# Altium footprint library IC.PcbLib: 220 footprints (part 6 of 14)
Each footprint in its own frame and in the unit in brackets; x right, y up, seen from the top. Pads: shape width x height; smd on the part's side, far side on the other; paste and mask are expansions set on the pad; w line width, h text height; cw(c..) or ccw(c..) is an arc to the next point about the centre after c.
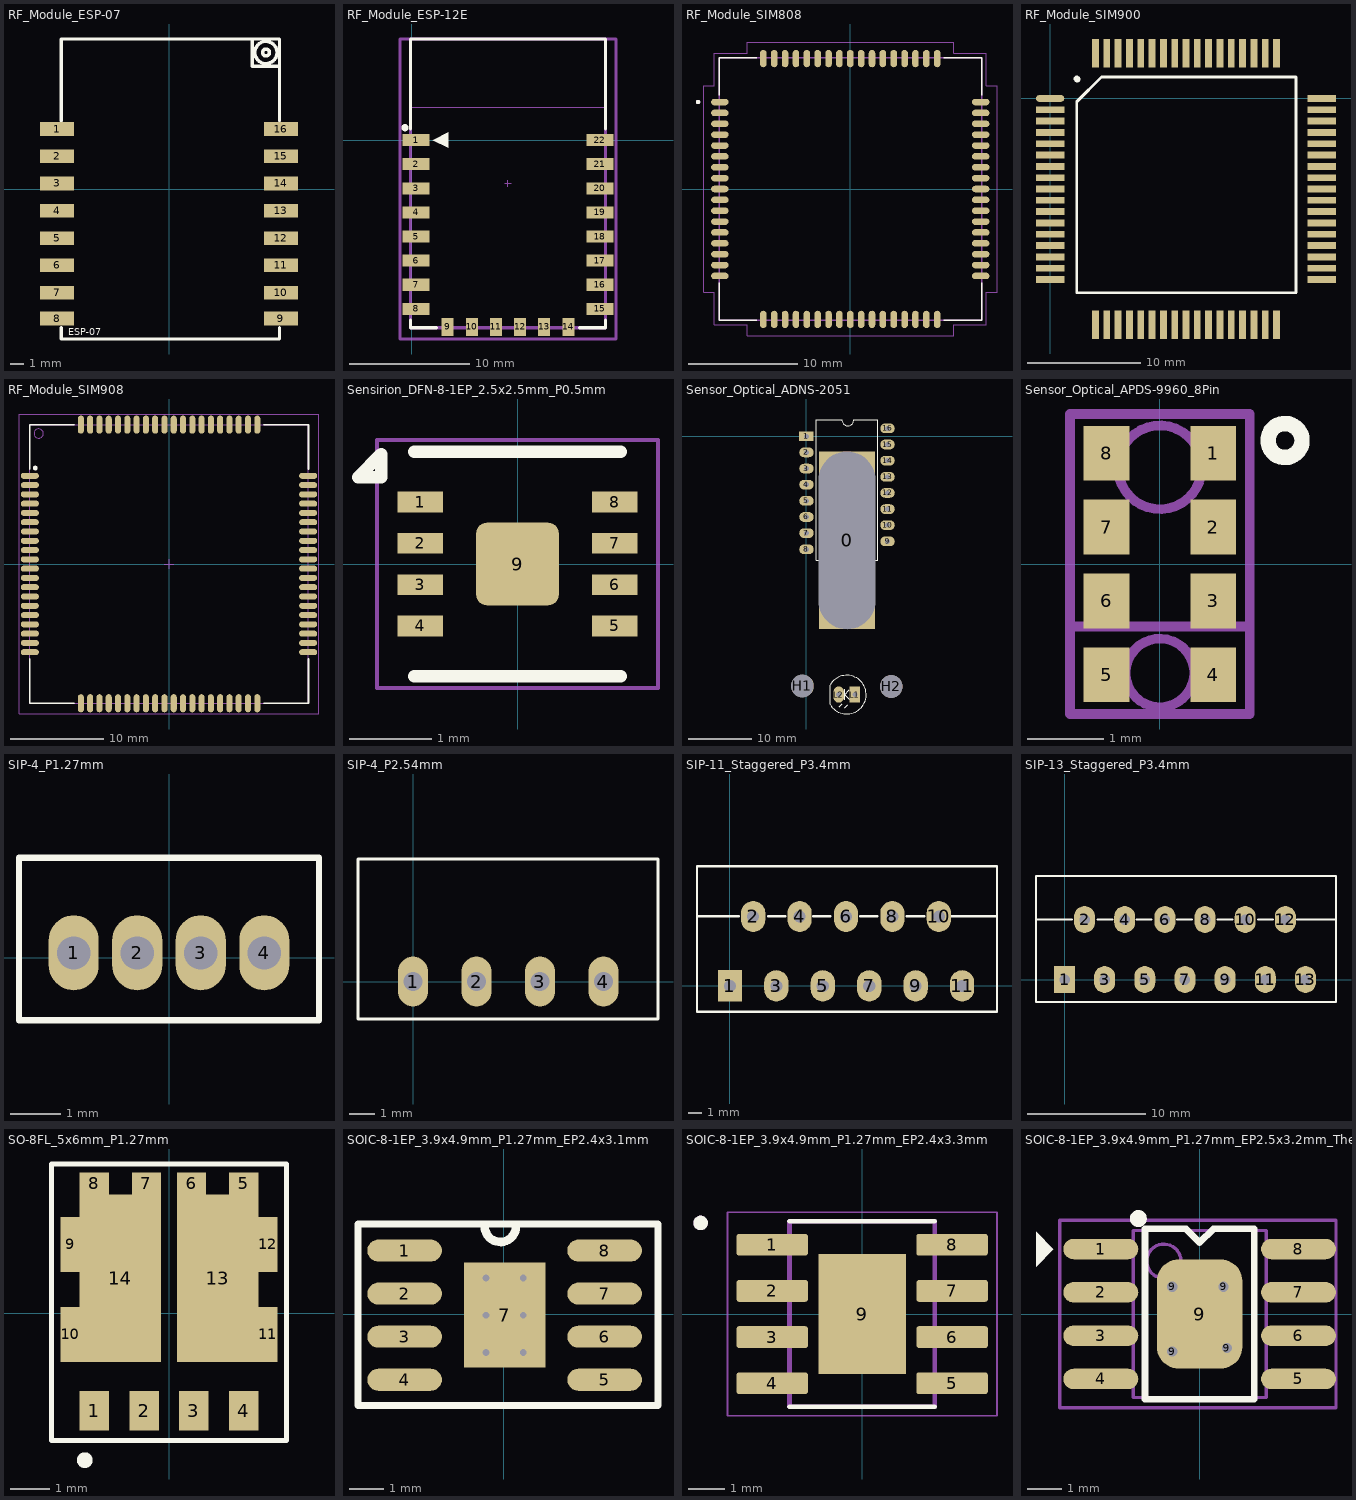
[diagram p5: the footprints below, top view; thin cyan lines are the x and y axes]

## RF_Module_ESP-07 [mil] "Ai-Thinker ESP-07 ESP8266 Wi-Fi module, 16 pads, pitch 2.0mm"
pads (16):
  rect 98.4x39.4 smd: 1(-323,173) 2(-323,95) 3(-323,16) 4(-323,-63) 5(-323,-142) 6(-323,-220) 7(-323,-299) 8(-323,-374) 9(323,-374) 10(323,-299) 11(323,-220) 12(323,-142) 13(323,-63) 14(323,16) 15(323,95) 16(323,173)
Top Overlay:
  circle w10: c280,394 r10
  circle w10: c280,394 r32
  lines w10: -311,-400 -311,-433 319,-433 319,-400 ; -311,197 -311,433 240,433 ; 319,197 319,354 ; 240,433 240,354 319,354 ; 240,433 319,433 319,354
  text "ESP-07" at -291,-422 h20
3D body "ESP07.STEP": height 137.87, standoff -0.39, extent -311,-434.15 318.92,432

## RF_Module_ESP-12E [mm] "Ai-Thinker ESP-12E/F ESP8266 Wi-Fi module, 22 pads, pitch 2.0mm"
height 3.2
pads (22):
  rect 2.25x1 smd: 1(0.375,0) 2(0.375,-2) 3(0.375,-4) 4(0.375,-6) 5(0.375,-8) 6(0.375,-10) 7(0.375,-12) 8(0.375,-14) 15(15.625,-14) 16(15.625,-12) 17(15.625,-10) 18(15.625,-8) 19(15.625,-6) 20(15.625,-4) 21(15.625,-2) 22(15.625,0)
  rect 1x1.5 smd: 9(3,-15.5) 10(5,-15.5) 11(7,-15.5) 12(9,-15.5) 13(11,-15.5) 14(13,-15.5)
Top Overlay:
  circle w0.3: c-0.55,1.025 r0.15
  region: 1.77,0 3.04,-0.635 3.04,0.635
  lines w0.254: -0.084,-14.916 -0.084,-15.568 2.068,-15.568 ; -0.084,0.916 -0.084,8.371 16.084,8.371 16.084,0.916 ; 13.932,-15.568 16.084,-15.568 16.084,-14.916
Mechanical 13:
  lines w0.051: -0.127,2.727 16.129,2.727 16.129,8.382 -0.127,8.382 -0.127,2.727
  lines w0.254: -0.084,-15.568 -0.084,8.371 16.084,8.371 16.084,-15.568 -0.084,-15.568
  text "ANTENNA AREA" at 0.127,7.874 h0.25
  text "CUTOUT POLYGON" at 0.127,7.366 h0.25
Mechanical 15:
  lines w0.1: 7.746,-3.598 8.254,-3.598 ; 8,-3.852 8,-3.344
  lines w0.254: -0.975,-16.5 16.975,-16.5 16.975,8.371 -0.975,8.371 -0.975,-16.5
3D body "ESP_12_E.STEP": height 2.75, standoff 0.04, extent 0.001,-15.491 16.001,8.509

## RF_Module_SIM808 [mm] "SIMCom SIM808 GSM/GPRS + GPS module, 68 pads, pitch 1.0mm"
pads (68):
  oval 1.6x0.6 smd: 1(-12,8) 2(-12,7) 3(-12,6) 4(-12,5) 5(-12,4) 6(-12,3) 7(-12,2) 8(-12,1) 9(-12,0) 10(-12,-1) 11(-12,-2) 12(-12,-3) 13(-12,-4) 14(-12,-5) 15(-12,-6) 16(-12,-7) 17(-12,-8) 35(12,-8) 36(12,-7) 37(12,-6) 38(12,-5) 39(12,-4) 40(12,-3) 41(12,-2) 42(12,-1) 43(12,0) 44(12,1) 45(12,2) 46(12,3) 47(12,4) 48(12,5) 49(12,6) 50(12,7) 51(12,8)
  oval 0.6x1.6 smd: 18(-8,-12) 19(-7,-12) 20(-6,-12) 21(-5,-12) 22(-4,-12) 23(-3,-12) 24(-2,-12) 25(-1,-12) 26(0,-12) 27(1,-12) 28(2,-12) 29(3,-12) 30(4,-12) 31(5,-12) 32(6,-12) 33(7,-12) 34(8,-12) 52(8,12) 53(7,12) 54(6,12) 55(5,12) 56(4,12) 57(3,12) 58(2,12) 59(1,12) 60(0,12) 61(-1,12) 62(-2,12) 63(-3,12) 64(-4,12) 65(-5,12) 66(-6,12) 67(-7,12) 68(-8,12)
Top Overlay:
  circle w0.2: c-14,8 r0.1
  lines w0.127: -12.075,-8.62 -12.075,-12.075 -8.62,-12.075 ; -12.075,8.62 -12.075,12.075 -8.62,12.075 ; 8.62,-12.075 12.075,-12.075 12.075,-8.62 ; 8.62,12.075 12.075,12.075 12.075,8.62
Mechanical 13:
  circle w0.2: c-14,8 r0.1
  lines w0.127: -12.075,-12.075 -12.075,12.075 12.075,12.075 12.075,-12.075 -12.075,-12.075
Mechanical 15:
  lines w0.05: -13.5,-9.5 -13.5,9.5 -12.5,9.5 -12.5,12.5 -9.5,12.5 -9.5,13.5 9.5,13.5 9.5,12.5 12.5,12.5 12.5,9.5 13.5,9.5 13.5,-9.5 12.5,-9.5 12.5,-12.5 9.5,-12.5 9.5,-13.5 -9.5,-13.5 -9.5,-12.5 -12.5,-12.5 -12.5,-9.5 -13.5,-9.5
3D body "SIM808--3DModel-STEP-56544.STEP": height 2.8, standoff 0, extent -12,-11.935 12,12.065

## RF_Module_SIM900 [mm] "SIMCom SIM900/900A GSM/GPRS module, 68 pads, pitch 1.0mm"
pads (68):
  oval 2.5x0.6 smd: 1(0,0)
  rect 2.5x0.6 smd: 2(0,-1) 3(0,-2) 4(0,-3) 5(0,-4) 6(0,-5) 7(0,-6) 8(0,-7) 9(0,-8) 10(0,-9) 11(0,-10) 12(0,-11) 13(0,-12) 14(0,-13) 15(0,-14) 16(0,-15) 17(0,-16) 35(24,-16) 36(24,-15) 37(24,-14) 38(24,-13) 39(24,-12) 40(24,-11) 41(24,-10) 42(24,-9) 43(24,-8) 44(24,-7) 45(24,-6) 46(24,-5) 47(24,-4) 48(24,-3) 49(24,-2) 50(24,-1) 51(24,0)
  rect 0.6x2.5 smd: 18(4,-20) 19(5,-20) 20(6,-20) 21(7,-20) 22(8,-20) 23(9,-20) 24(10,-20) 25(11,-20) 26(12,-20) 27(13,-20) 28(14,-20) 29(15,-20) 30(16,-20) 31(17,-20) 32(18,-20) 33(19,-20) 34(20,-20) 52(20,4) 53(19,4) 54(18,4) 55(17,4) 56(16,4) 57(15,4) 58(14,4) 59(13,4) 60(12,4) 61(11,4) 62(10,4) 63(9,4) 64(8,4) 65(7,4) 66(6,4) 67(5,4) 68(4,4)
Top Overlay:
  lines w0.25: 2.586,-17.16 21.697,-17.16 21.717,-17.14 21.717,1.547 ; 2.675,-17.163 2.357,-17.163 2.347,-17.153 2.347,-0.297 4.526,1.882 21.707,1.882 21.714,1.875 21.714,1.478
  lines w0.55: 2.349,1.73 2.4,1.679 2.413,1.679 2.416,1.679 2.423,1.687
3D body "SIM900.step": height 3.04, standoff 0.02, extent 0,-20 24,4

## RF_Module_SIM908 [mm] "SIMCom SIM908 GSM/GPRS + GPS module, 80 pads, pitch 1.0mm"
height 3
pads (80):
  oval 1.95x0.65 smd: 1(-15,9.5) 2(-15,8.5) 3(-15,7.5) 4(-15,6.5) 5(-15,5.5) 6(-15,4.5) 7(-15,3.5) 8(-15,2.5) 9(-15,1.5) 10(-15,0.5) 11(-15,-0.5) 12(-15,-1.5) 13(-15,-2.5) 14(-15,-3.5) 15(-15,-4.5) 16(-15,-5.5) 17(-15,-6.5) 18(-15,-7.5) 19(-15,-8.5) 20(-15,-9.5) 41(14.98,-9.5) 42(14.98,-8.5) 43(14.98,-7.5) 44(14.98,-6.5) 45(14.98,-5.5) 46(14.98,-4.5) 47(14.98,-3.5) 48(14.98,-2.5) 49(14.98,-1.5) 50(14.98,-0.5) 51(14.98,0.5) 52(14.98,1.5) 53(14.98,2.5) 54(14.98,3.5) 55(14.98,4.5) 56(14.98,5.5) 57(14.98,6.5) 58(14.98,7.5) 59(14.98,8.5) 60(14.98,9.5)
  oval 0.65x1.95 smd: 21(-9.5,-15) 22(-8.5,-15) 23(-7.5,-15) 24(-6.5,-15) 25(-5.5,-15) 26(-4.5,-15) 27(-3.5,-15) 28(-2.5,-15) 29(-1.5,-15) 30(-0.5,-15) 31(0.5,-15) 32(1.5,-15) 33(2.5,-15) 34(3.5,-15) 35(4.5,-15) 36(5.5,-15) 37(6.5,-15) 38(7.5,-15) 39(8.5,-15) 40(9.5,-15) 61(9.5,15.005) 62(8.5,15.005) 63(7.5,15.005) 64(6.5,15.005) 65(5.5,15.005) 66(4.5,15.005) 67(3.5,15.005) 68(2.5,15.005) 69(1.5,15.005) 70(0.5,15.005) 71(-0.5,15.005) 72(-1.5,15.005) 73(-2.5,15.005) 74(-3.5,15.005) 75(-4.5,15.005) 76(-5.5,15.005) 77(-6.5,15.005) 78(-7.5,15.005) 79(-8.5,15.005) 80(-9.5,15.005)
Top Overlay:
  circle w0.25: c-14.405,10.335 r0.125
  lines w0.2: -15,-10.225 -15,-15 -10.225,-15 ; -15,10.225 -15,15 -10.225,15 ; 10.225,-15 15,-15 15,-10.225 ; 10.225,15 15,15 15,10.225
Mechanical 13:
  circle w0.1: c-14.05,14.05 r0.5
  lines w0.1: -15,-15 -15,15 15,15 15,-15 -15,-15
Mechanical 15:
  lines w0.1: -0.5,0 0.5,0 ; 0,-0.5 0,0.5 ; -16.145,-16.155 -16.145,16.155 16.125,16.155 16.125,-16.155 -16.145,-16.155
3D body "User Library-SIM908.STEP": height 3.22, standoff 0.02, extent -14.995,-15 15.005,15

## Sensirion_DFN-8-1EP_2.5x2.5mm_P0.5mm [mm] "DFN-8 2.5x2.5mm pitch 0.5mm humidity/temperature sensor (SHT30/SHT31)"
height 0.93
pads (9):
  rect 0.55x0.25 smd: 1(-1.175,0.75) 2(-1.175,0.25) 3(-1.175,-0.25) 4(-1.175,-0.75) 5(1.175,-0.75) 6(1.175,-0.25) 7(1.175,0.25) 8(1.175,0.75)
  rrect25% 1x1 smd: 9(0,0)
Top Overlay:
  lines w0.15: -1.25,-1.36 1.25,-1.36 ; -1.25,1.36 1.25,1.36 ; -1.93,1.05 -1.65,1.05 -1.65,1.33 -1.93,1.05
Mechanical 4:
  lines w0.05: -1.7,-1.5 -1.7,1.5 1.7,1.5 1.7,-1.5 -1.7,-1.5
3D body "Sensirion_DFN-8.step": height 0.93, standoff 0, extent -1.25,-1.25 1.25,1.25

## Sensor_Optical_ADNS-2051 [mil] "Avago ADNS-2051 optical mouse sensor DIP-16 + lens mount"
pads (21):
  rect 350x1100 hole 350 slot 1100 at 90 deg: 0(251,-645)
  rect 90x60 hole 31: 1(0,0)
  oval 90x60 hole 31: 2(0,-100) 3(0,-200) 4(0,-300) 5(0,-400) 6(0,-500) 7(0,-600) 8(0,-700) 9(502,-651) 10(502,-551) 11(502,-451) 12(502,-351) 13(502,-251) 14(502,-151) 15(502,-51) 16(502,49)
  round 140 hole 140: H1(-25,-1547) H2(525,-1550)
  rect 65x100 hole 32: L1(300,-1600.5)
  oval 65x100 hole 32: L2(200,-1600.5)
Top Overlay:
  lines w7: 146,-1660.5 146,-1541.5 ; 146.06,-1540.53 cw(c250,-1600.5) 146.49,-1661.21 ; 204,-1675.5 221,-1658.5 ; 218,103 59,103 59,-767 443,-767 443,103 296,103 ; 218.97,101 ccw(c255.99,101) 293,101 ; 236,-1632.5 236,-1566.5 ; 238,-1681.5 255,-1664.5 ; 265,-1629.5 236,-1600.5 265,-1571.5 ; 394.94,-516.95 ccw(c252.8,-525.96) 395,-518
  text "ADNS2051" at 108,-229 h40
3D body "Sensor_Optical_ADNS-2051.step": height 157.48, standoff -118.11, extent -48.62,-1699.71 548.62,128.21

## Sensor_Optical_APDS-9960_8Pin [mm] "Broadcom APDS-9960 optical gesture/RGB sensor, 8 pins"
pads (8):
  rect 0.6x0.72 smd: 1(0.7,1.455) 2(0.7,0.485) 3(0.7,-0.485) 4(0.7,-1.455) 5(-0.7,-1.455) 6(-0.7,-0.485) 7(-0.7,0.485) 8(-0.7,1.455)
Top Overlay:
  circle w0.203: c1.644,1.622 r0.223
Mechanical 13:
  circle w0.127: c0,-1.43 r0.45
  circle w0.127: c0,1.27 r0.55
  lines w0.127: -1.18,-0.82 1.18,-0.82 ; -1.18,-0.82 -1.18,-1.97 1.18,-1.97 1.18,-0.82 ; -1.18,-0.82 -1.18,1.97 1.18,1.97 1.18,-0.82
3D body "step_temp.STEP": height 1.55, standoff 0, extent -1.18,-1.97 1.18,1.97

## SIP-4_P1.27mm [mm] "SIP-4 single-inline package, pitch 1.27mm"
pads (4):
  oval 1x1.5 hole 0.66 mask+0.076: 1(-1.905,0.1) 2(-0.635,0.1) 3(0.635,0.1) 4(1.905,0.1)
Top Overlay:
  lines w0.127: -2.75,2 -3,2 ; -3,2 -3,-1.25 3,-1.25 3,2 -3,2
3D body "HIH8120-021-001S.stp": height 1.76, standoff -4.24, extent -2.45,-0.605 2.45,1.3

## SIP-4_P2.54mm [mm] "SIP-4 single-inline package, pitch 2.54mm"
height 9.982
pads (4):
  oval 1.2x2 hole 0.75 mask+0.076: 1(0,0) 2(2.54,0) 3(5.08,0) 4(7.62,0)
Top Overlay:
  lines w0.127: -1.095,4.9 9.8,4.9 9.8,-1.5 -2.2,-1.5 -2.2,4.9 -0.845,4.9
3D body "User Library-4-Lead SIP_AM1S-1205SZ_Aimtec_DC-DC_Converter_1_Watt.step": height 10.16, standoff -3.04, extent -2.042,-1.3 9.642,4.7

## SIP-11_Staggered_P3.4mm [mil] "11-pin staggered SIP/ZIP power package, row spacing 5.08mm"
pads (11):
  rect 70x90 hole 35: 1(0,0)
  oval 70x90 hole 35: 2(66.93,200) 3(133.86,0) 4(200.79,200) 5(267.72,0) 6(334.65,200) 7(401.57,0) 8(468.5,200) 9(535.43,0) 10(602.36,200) 11(669.29,0)
Top Overlay:
  lines w7: -95,200 25,200 ; 110,200 160,200 ; 240,200 290,200 ; 375,200 425,200 ; 510,200 560,200 ; 630,200 770,200 ; -95,-75 770,-75 770,345 -95,345 -95,-75
3D body "SIP-11_Staggered_P3.4mm.step": height 531.5, standoff -118.11, extent -94.06,-12.6 763.35,212.6

## SIP-13_Staggered_P3.4mm [mil] "13-pin staggered SIP/ZIP power package, row spacing 5.08mm"
pads (13):
  rect 70x90 hole 35: 1(0,0)
  oval 70x90 hole 35: 2(66.93,200) 3(133.86,0) 4(200.79,200) 5(267.72,0) 6(334.65,200) 7(401.57,0) 8(468.5,200) 9(535.43,0) 10(602.36,200) 11(669.29,0) 12(736.22,200) 13(803.15,0)
Top Overlay:
  lines w7: -95,200 25,200 ; 110,200 160,200 ; 240,200 290,200 ; 375,200 425,200 ; 510,200 560,200 ; 645,200 695,200 ; 775,200 905,200 ; -95,-75 905,-75 905,345 -95,345 -95,-75
3D body "SIP-13_Staggered_P3.4mm.step": height 531.5, standoff -118.11, extent -94.06,-12.6 897.2,212.6

## SO-8FL_5x6mm_P1.27mm [mm] "SO-8FL (DFN-8 5x6 power MOSFET package), pitch 1.27mm"
height 1.1
pads (14):
  rect 0.75x1 smd: 1(-1.905,-2.492) 2(-0.635,-2.492) 3(0.635,-2.492) 4(1.905,-2.492)
  rect 0.75x0.56 smd: 5(1.905,3.317) 6(0.575,3.317) 7(-0.575,3.317) 8(-1.905,3.317)
  rect 0.495x1.4 smd: 9(-2.527,1.757) 10(-2.527,-0.543) 11(2.527,-0.543) 12(2.527,1.757)
  rect 2.08x4.28 smd: 13(1.24,0.897) 14(-1.24,0.897)
Top Overlay:
  lines w0.127: -3,-3.25 3,-3.25 3,3.81 -3,3.81 -3,-3.25
  lines w0.2: -2.25,-3.75 ccw(c-2.15,-3.75) -2.05,-3.75 ccw(c-2.15,-3.75) -2.25,-3.75
3D body "User Library-DFN8-5X6 DUAL.step": height 1.11, standoff 0.01, extent -2.575,-2.775 2.575,3.375

## SOIC-8-1EP_3.9x4.9mm_P1.27mm_EP2.4x3.1mm [mm] "SOIC-8 with exposed pad, body 3.9x4.9mm, pitch 1.27mm, span 5.90mm"
pads (9):
  oval 2.2x0.65 smd: 1(-2.925,1.88) 2(-2.925,0.61) 3(-2.925,-0.66) 4(-2.925,-1.93) 5(2.975,-1.93) 6(2.975,-0.66) 7(2.975,0.61) 8(2.975,1.88)
  rect 2.4x3.1 smd: 7(0.025,-0.025)
via -0.525,1.075 diameter 0.5 hole 0.2
via 0.575,1.075 diameter 0.5 hole 0.2
via -0.525,-0.025 diameter 0.5 hole 0.2
via 0.575,-0.025 diameter 0.5 hole 0.2
via -0.525,-1.125 diameter 0.5 hole 0.2
via 0.575,-1.125 diameter 0.5 hole 0.2
Top Overlay:
  lines w0.2: -4.3,-2.692 -4.3,2.667 4.55,2.667 4.55,-2.692 -4.3,-2.692
  lines w0.254: -0.559,2.615 ccw(c-0.102,2.591) 0.356,2.591
3D body "SOIC127P600-8N.step": height 1.7, standoff 0, extent -2.974,-2.525 3.025,2.475

## SOIC-8-1EP_3.9x4.9mm_P1.27mm_EP2.4x3.3mm [mm] "SOIC-8 with exposed pad (ESOP-8), body 3.9x4.9mm, pitch 1.27mm"
height 1.75
pads (9):
  rrect25% 1.97x0.6 smd: 1(-2.475,1.905) 2(-2.475,0.635) 3(-2.475,-0.635) 4(-2.475,-1.905) 5(2.475,-1.905) 6(2.475,-0.635) 7(2.475,0.635) 8(2.475,1.905)
  rect 2.413x3.302 smd paste-3: 9(0,0)
Top Overlay:
  circle w0.2: c-4.445,2.505 r0.1
  lines w0.127: -2,-2.55 2,-2.55 ; -2,2.55 2,2.55
Top Paste:
  region: 0.645,-0.82 -0.645,-0.82 -0.645,0.82 0.645,0.82
Mechanical 13:
  circle w0.2: c-4.445,2.505 r0.1
  lines w0.127: -2,-2.55 -2,2.55 2,2.55 2,-2.55 -2,-2.55
Mechanical 15:
  lines w0.05: -3.71,-2.8 -3.71,2.8 3.71,2.8 3.71,-2.8 -3.71,-2.8
3D body "step_temp.STEP": height 1.75, standoff 0, extent -3,-2.45 3,2.45

## SOIC-8-1EP_3.9x4.9mm_P1.27mm_EP2.5x3.2mm_ThermalVias [mm] "SOIC-8 PowerPAD with thermal vias, body 3.9x4.9mm, pitch 1.27mm (TPS54331/5430)"
height 1.75
pads (13):
  oval 2.2x0.6 smd: 1(-2.9,1.905) 2(-2.9,0.635) 3(-2.9,-0.635) 4(-2.9,-1.905) 5(2.9,-1.905) 6(2.9,-0.635) 7(2.9,0.635) 8(2.9,1.905)
  round 0.4 hole 0.3: 9(-0.8,-1.1) 9(-0.8,0.8) 9(0.7,0.8) 9(0.8,-1)
  rrect50% 2.5x3.2 smd: 9(0,0)
Top Overlay:
  circle w0.25: c-1.8,2.8 r0.125
  region: -4.8,1.392 -4.292,1.9 -4.8,2.408
  lines w0.2: -1.6,-2.5 -1.6,2.5 -0.4,2.5 0,2.1 0.4,2.5 1.6,2.5 1.6,-2.5 -1.6,-2.5
Mechanical 13:
  circle w0.1: c-1.05,1.55 r0.5
  lines w0.1: -1.95,-2.45 -1.95,2.45 1.95,2.45 1.95,-2.45 -1.95,-2.45
Mechanical 15:
  lines w0.1: -0.5,0 0.5,0 ; 0,-0.5 0,0.5 ; -4.1,-2.75 -4.1,2.75 4,2.75 4,-2.75 -4.1,-2.75
3D body "User Library-sop-8.STEP": height 1.6, standoff 0, extent -2.894,-2.434 3.148,2.586